# Altium footprint library Toi Library.PcbLib: 740 footprints (part 31 of 47)
Each footprint in its own frame and in the unit in brackets; x right, y up, seen from the top. Pads: shape width x height; smd on the part's side, far side on the other; paste and mask are expansions set on the pad; w line width, h text height; cw(c..) or ccw(c..) is an arc to the next point about the centre after c.
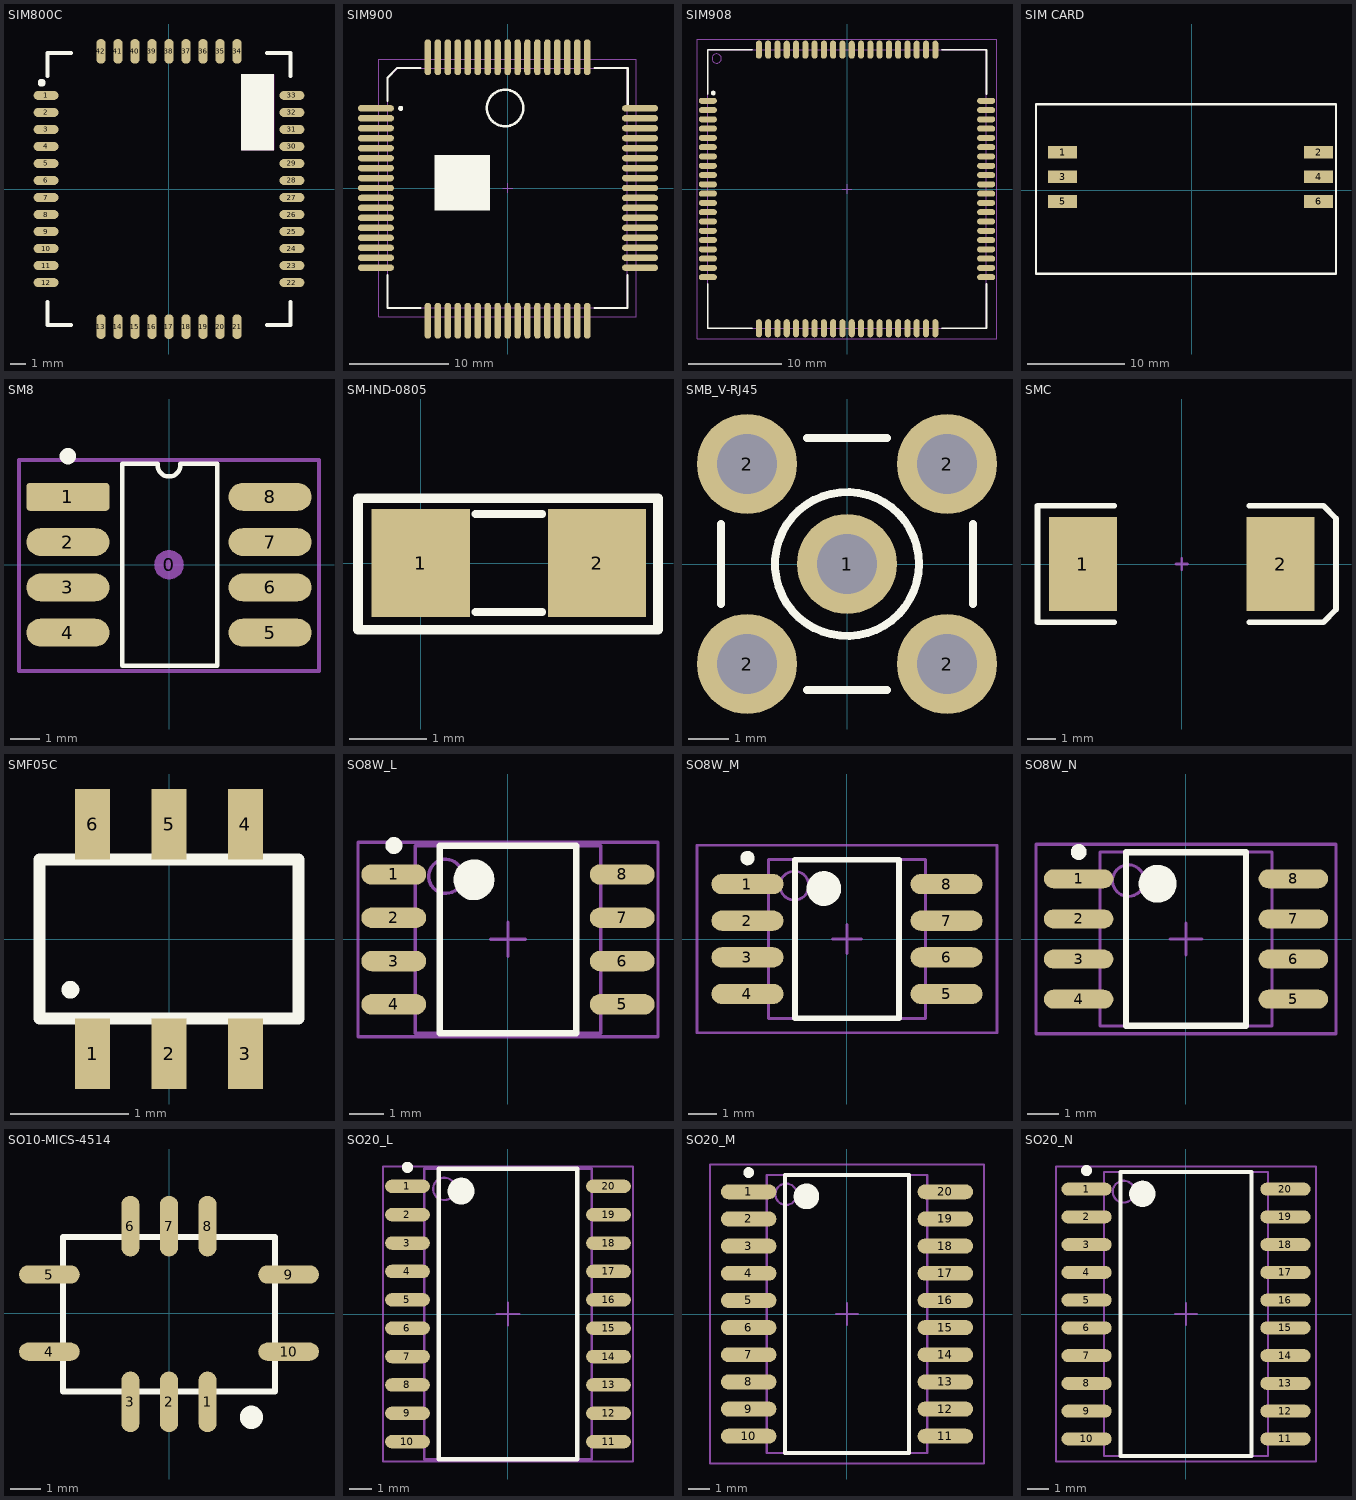
[diagram p30: the footprints below, top view; thin cyan lines are the x and y axes]

## SIM800C [mm]
pads (42):
  oval 1.6x0.6 smd: 1(-7.95,6.05) 2(-7.95,4.95) 3(-7.95,3.85) 4(-7.95,2.75) 5(-7.95,1.65) 6(-7.95,0.55) 7(-7.95,-0.55) 8(-7.95,-1.65) 9(-7.95,-2.75) 10(-7.95,-3.85) 11(-7.95,-4.95) 12(-7.95,-6.05) 22(7.95,-6.05) 23(7.95,-4.95) 24(7.95,-3.85) 25(7.95,-2.75) 26(7.95,-1.65) 27(7.95,-0.55) 28(7.95,0.55) 29(7.95,1.65) 30(7.95,2.75) 31(7.95,3.85) 32(7.95,4.95) 33(7.95,6.05)
  oval 0.6x1.6 smd: 13(-4.4,-8.9) 14(-3.3,-8.9) 15(-2.2,-8.9) 16(-1.1,-8.9) 17(0,-8.9) 18(1.1,-8.9) 19(2.2,-8.9) 20(3.3,-8.9) 21(4.4,-8.9) 34(4.4,8.9) 35(3.3,8.9) 36(2.2,8.9) 37(1.1,8.9) 38(0,8.9) 39(-1.1,8.9) 40(-2.2,8.9) 41(-3.3,8.9) 42(-4.4,8.9)
Top Layer keep-out:
  lines w0.152: 4.726,2.556 4.726,7.354 6.731,7.354 6.731,2.556 4.726,2.556
Top Overlay:
  circle w0.254: c-8.23,6.869 r0.127
  rectangle: 4.65,2.48 6.8,7.43
  lines w0.254: -7.85,-7.3 -7.85,-8.8 -6.35,-8.8 ; -7.85,7.3 -7.85,8.8 -6.35,8.8 ; 6.35,-8.8 7.85,-8.8 7.85,-7.3 ; 6.35,8.8 7.85,8.8 7.85,7.3
3D body "User Library-SIM800C-1.STEP": height 2.47, standoff 0.13, extent -7.723,-8.964 7.977,8.636

## SIM900 [mm]
pads (68):
  oval 3.6x0.65 smd: 1(-13.21,8) 2(-13.21,7) 3(-13.21,6) 4(-13.21,5) 5(-13.21,4) 6(-13.21,3) 7(-13.21,2) 8(-13.21,1) 9(-13.21,0) 10(-13.21,-1) 11(-13.21,-2) 12(-13.21,-3) 13(-13.21,-4) 14(-13.21,-5) 15(-13.21,-6) 16(-13.21,-7) 17(-13.21,-8) 35(13.3,-8) 36(13.3,-7) 37(13.3,-6) 38(13.3,-5) 39(13.3,-4) 40(13.3,-3) 41(13.3,-2) 42(13.3,-1) 43(13.3,0) 44(13.3,1) 45(13.3,2) 46(13.3,3) 47(13.3,4) 48(13.3,5) 49(13.3,6) 50(13.3,7) 51(13.3,8)
  oval 0.65x3.6 smd: 18(-8,-13.32) 19(-7,-13.32) 20(-6,-13.32) 21(-5,-13.32) 22(-4,-13.32) 23(-3,-13.32) 24(-2,-13.32) 25(-1,-13.32) 26(0,-13.32) 27(1,-13.32) 28(2,-13.32) 29(3,-13.32) 30(4,-13.32) 31(5,-13.32) 32(6,-13.32) 33(7,-13.32) 34(8,-13.32) 52(8,13.12) 53(7,13.12) 54(6,13.12) 55(5,13.12) 56(4,13.12) 57(3,13.12) 58(2,13.12) 59(1,13.12) 60(0,13.12) 61(-1,13.12) 62(-2,13.12) 63(-3,13.12) 64(-4,13.12) 65(-5,13.12) 66(-6,13.12) 67(-7,13.12) 68(-8,13.12)
Top Overlay:
  circle w0.25: c-10.725,7.99 r0.125
  circle w0.254: c-0.25,8.03 r1.832
  rectangle: -7.35,-2.27 -1.75,3.33
  lines w0.2: -12.05,-8.725 -12.05,-12.05 -8.725,-12.05 ; -12.05,8.725 -12.05,11.05 -11.05,12.05 -8.725,12.05 ; 8.725,-12.05 12.05,-12.05 12.05,-8.725 ; 8.725,12.05 12.05,12.05
  lines w0.254: 12.05,8.03 12.05,12.03
Mechanical 13:
  lines w0.1: -12,-12 -12,11 -11,12 12,12 12,-12 -12,-12
Mechanical 15:
  lines w0.1: -0.5,0 0.5,0 ; 0,-0.5 0,0.5 ; -12.925,-12.925 -12.925,12.925 12.925,12.925 12.925,-12.925 -12.925,-12.925
3D body "User Library-GSM_SIM900.STEP": height 3, standoff 0, extent -12.01,-11.99 11.99,12.01

## SIM908 [mm]
height 3
pads (80):
  oval 1.95x0.65 smd: 1(-15,9.5) 2(-15,8.5) 3(-15,7.5) 4(-15,6.5) 5(-15,5.5) 6(-15,4.5) 7(-15,3.5) 8(-15,2.5) 9(-15,1.5) 10(-15,0.5) 11(-15,-0.5) 12(-15,-1.5) 13(-15,-2.5) 14(-15,-3.5) 15(-15,-4.5) 16(-15,-5.5) 17(-15,-6.5) 18(-15,-7.5) 19(-15,-8.5) 20(-15,-9.5) 41(14.98,-9.5) 42(14.98,-8.5) 43(14.98,-7.5) 44(14.98,-6.5) 45(14.98,-5.5) 46(14.98,-4.5) 47(14.98,-3.5) 48(14.98,-2.5) 49(14.98,-1.5) 50(14.98,-0.5) 51(14.98,0.5) 52(14.98,1.5) 53(14.98,2.5) 54(14.98,3.5) 55(14.98,4.5) 56(14.98,5.5) 57(14.98,6.5) 58(14.98,7.5) 59(14.98,8.5) 60(14.98,9.5)
  oval 0.65x1.95 smd: 21(-9.5,-15) 22(-8.5,-15) 23(-7.5,-15) 24(-6.5,-15) 25(-5.5,-15) 26(-4.5,-15) 27(-3.5,-15) 28(-2.5,-15) 29(-1.5,-15) 30(-0.5,-15) 31(0.5,-15) 32(1.5,-15) 33(2.5,-15) 34(3.5,-15) 35(4.5,-15) 36(5.5,-15) 37(6.5,-15) 38(7.5,-15) 39(8.5,-15) 40(9.5,-15) 61(9.5,15.005) 62(8.5,15.005) 63(7.5,15.005) 64(6.5,15.005) 65(5.5,15.005) 66(4.5,15.005) 67(3.5,15.005) 68(2.5,15.005) 69(1.5,15.005) 70(0.5,15.005) 71(-0.5,15.005) 72(-1.5,15.005) 73(-2.5,15.005) 74(-3.5,15.005) 75(-4.5,15.005) 76(-5.5,15.005) 77(-6.5,15.005) 78(-7.5,15.005) 79(-8.5,15.005) 80(-9.5,15.005)
Top Overlay:
  circle w0.25: c-14.405,10.335 r0.125
  lines w0.2: -15,-10.225 -15,-15 -10.225,-15 ; -15,10.225 -15,15 -10.225,15 ; 10.225,-15 15,-15 15,-10.225 ; 10.225,15 15,15 15,10.225
Mechanical 13:
  circle w0.1: c-14.05,14.05 r0.5
  lines w0.1: -15,-15 -15,15 15,15 15,-15 -15,-15
Mechanical 15:
  lines w0.1: -0.5,0 0.5,0 ; 0,-0.5 0,0.5 ; -16.145,-16.155 -16.145,16.155 16.125,16.155 16.125,-16.155 -16.145,-16.155
3D body "User Library-SIM908.STEP": height 3.22, standoff 0.02, extent -14.995,-15 15.005,15

## SIM CARD [mm]
pads (6):
  rect 3x1.3 smd: 1(-13.358,3.937) 2(13.104,3.937) 3(-13.358,1.397) 4(13.104,1.397) 5(-13.358,-1.143) 6(13.104,-1.143)
Top Overlay:
  lines w0.254: -16.111,-8.603 -16.111,8.897 14.889,8.897 14.889,-8.603 -16.111,-8.603
3D body "SW3dPS-SIMLOCK-1.STEP": height 2.5, standoff 0, extent -16.129,-8.537 13.871,8.763

## SM8 [mil]
pads (9):
  round 39.37 on Mech15: 0(0,0)
  rrect25% 110x37 smd: 1(-134,90)
  oval 110x37 smd: 2(-134,30) 3(-134,-30) 4(-134,-90) 5(134,-90) 6(134,-30) 7(134,30) 8(134,90)
Top Overlay:
  circle w19.68: c-134,144 r1
  lines w6: -15,132 ccw(c0,132) 15,132 ; -15,134 -29,134 -62,134 -62,-134 64,-134 64,134 15,134
Mechanical 15:
  lines w5: -198.82,-141 -198.82,139 198.82,139 198.82,-141 -198.82,-141
3D body "SM8.stp": height 66.93, standoff 0.09, extent -142.75,-129.92 142.76,129.92

## SM-IND-0805 [mil]
pads (2):
  rect 50x55 smd: 1(0,0) 2(90,0)
Top Overlay:
  lines w4: 28,-25 62,-25 ; 28,25 62,25
  lines w5: -32,-34 121,-34 121,33 -32,33 -32,-34
3D body "45635.stp": height 9.84, standoff -9.84, extent 5.63,-24.6 84.37,24.61

## SMB_V-RJ45 [mm]
pads (5):
  round 2.5 hole 1.5: 1(0,0) 2(-2.5,-2.5) 2(-2.5,2.5) 2(2.5,-2.5) 2(2.5,2.5)
Top Overlay:
  circle w0.2: c0,0 r1.8
  lines w0.2: -3.15,-1 -3.15,1 ; -1,-3.15 1,-3.15 ; -1,3.15 1,3.15 ; 3.15,-1 3.15,1
Mechanical 1:
  circle w0.025: c0,0 r0.2
  circle w0.025: c0,0 r1.05
  circle w0.025: c0,0 r1.8
3D body "Samtec-SMB5-J-P-H-RA-TH1.STEP": height 7.64, standoff -3.28, extent -16.765,-3.22 3.685,3.21

## SMC [mm]
height 5.08
pads (2):
  rect 2.4x3.3 smd: 1(-3.475,0) 2(3.475,0)
Top Overlay:
  lines w0.2: -2.375,-2.05 -5.075,-2.05 -5.075,2.05 -2.375,2.05 ; 2.375,-2.05 4.975,-2.05 5.425,-1.6 5.425,1.6 4.975,2.055 ; 2.375,2.05 4.975,2.05
Mechanical 1:
  lines w0.1: -0.2,0 0.2,0 ; 0,-0.2 0,0.2
3D body "User Library-445-CRYTAL-SMD.STEP": height 1.32, standoff -0.03, extent -2.449,-1.6 2.551,1.6

## SMF05C [mm]
pads (6):
  rect 0.3x0.6 smd: 1(-0.65,-0.975) 2(0,-0.975) 3(0.65,-0.975) 4(0.65,0.975) 5(0,0.975) 6(-0.65,0.975)
Top Overlay:
  circle w0.1: c-0.838,-0.432 r0.025
  lines w0.1: -1.1,-0.675 1.1,-0.675 1.1,0.675 -1.1,0.675 -1.1,-0.675
3D body "SC88-6.STEP": height 1.1, standoff 0, extent -1.009,-1.049 0.991,1.151

## SO8W_L [mm] "SOP, 8-Leads, Body 5.3x5.3mm, Pitch 1.27mm, IPC High Density"
height 2.13
pads (8):
  oval 1.9x0.6 smd: 1(-3.35,1.905) 2(-3.35,0.635) 3(-3.35,-0.635) 4(-3.35,-1.905) 5(3.35,-1.905) 6(3.35,-0.635) 7(3.35,0.635) 8(3.35,1.905)
Top Overlay:
  circle w0.6: c-1,1.75 r0.3
  circle w0.25: c-3.35,2.755 r0.125
  lines w0.2: -2,-2.75 2,-2.75 2,2.75 -2,2.75 -2,-2.75
Mechanical 13:
  circle w0.1: c-1.825,1.85 r0.5
  lines w0.1: -2.725,-2.75 2.725,-2.75 2.725,2.75 -2.725,2.75 -2.725,-2.75
Mechanical 15:
  lines w0.1: -0.5,0 0.5,0 ; 0,-0.5 0,0.5 ; -4.4,-2.85 4.4,-2.85 4.4,2.85 -4.4,2.85 -4.4,-2.85
3D body: height 2.13, standoff 0, extent -2.725,-2.75 2.725,2.75

## SO8W_M [mm] "SOP, 8-Leads, Body 5.3x5.3mm, Pitch 1.27mm, IPC Low Density"
height 2.13
pads (8):
  oval 2.5x0.7 smd: 1(-3.45,1.905) 2(-3.45,0.635) 3(-3.45,-0.635) 4(-3.45,-1.905) 5(3.45,-1.905) 6(3.45,-0.635) 7(3.45,0.635) 8(3.45,1.905)
Top Overlay:
  circle w0.6: c-0.8,1.75 r0.3
  circle w0.25: c-3.45,2.805 r0.125
  lines w0.2: -1.8,-2.75 1.8,-2.75 1.8,2.75 -1.8,2.75 -1.8,-2.75
Mechanical 13:
  circle w0.1: c-1.825,1.85 r0.5
  lines w0.1: -2.725,-2.75 2.725,-2.75 2.725,2.75 -2.725,2.75 -2.725,-2.75
Mechanical 15:
  lines w0.1: -0.5,0 0.5,0 ; 0,-0.5 0,0.5 ; -5.2,-3.25 5.2,-3.25 5.2,3.25 -5.2,3.25 -5.2,-3.25
3D body: height 2.13, standoff 0, extent -2.725,-2.75 2.725,2.75

## SO8W_N [mm] "SOP, 8-Leads, Body 5.3x5.3mm, Pitch 1.27mm, IPC Medium Density"
height 2.13
pads (8):
  oval 2.2x0.6 smd: 1(-3.4,1.905) 2(-3.4,0.635) 3(-3.4,-0.635) 4(-3.4,-1.905) 5(3.4,-1.905) 6(3.4,-0.635) 7(3.4,0.635) 8(3.4,1.905)
Top Overlay:
  circle w0.6: c-0.9,1.75 r0.3
  circle w0.25: c-3.4,2.755 r0.125
  lines w0.2: -1.9,-2.75 1.9,-2.75 1.9,2.75 -1.9,2.75 -1.9,-2.75
Mechanical 13:
  circle w0.1: c-1.825,1.85 r0.5
  lines w0.1: -2.725,-2.75 2.725,-2.75 2.725,2.75 -2.725,2.75 -2.725,-2.75
Mechanical 15:
  lines w0.1: -0.5,0 0.5,0 ; 0,-0.5 0,0.5 ; -4.75,-3 4.75,-3 4.75,3 -4.75,3 -4.75,-3
3D body: height 2.13, standoff 0, extent -2.725,-2.75 2.725,2.75

## SO10-MICS-4514 [mm] "10 pn"
pads (10):
  oval 0.6x2 smd: 1(1.27,-2.921) 2(0,-2.921) 3(-1.27,-2.921) 6(-1.27,2.863) 7(0,2.863) 8(1.27,2.863)
  oval 2x0.6 smd: 4(-3.937,-1.27) 5(-3.937,1.27) 9(3.937,1.27) 10(3.937,-1.27)
Top Overlay:
  circle w0.6: c2.713,-3.429 r0.081
  lines w0.203: -3.492,-2.574 -3.492,2.506 3.492,2.506 3.492,-2.574 -3.492,-2.574

## SO20_L [mm] "SOIC, 20-Leads, Body 12.8x7.5mm, Pitch 1.27mm, IPC High Density"
height 2.65
pads (20):
  oval 2x0.6 smd: 1(-4.5,5.715) 2(-4.5,4.445) 3(-4.5,3.175) 4(-4.5,1.905) 5(-4.5,0.635) 6(-4.5,-0.635) 7(-4.5,-1.905) 8(-4.5,-3.175) 9(-4.5,-4.445) 10(-4.5,-5.715) 11(4.5,-5.715) 12(4.5,-4.445) 13(4.5,-3.175) 14(4.5,-1.905) 15(4.5,-0.635) 16(4.5,0.635) 17(4.5,1.905) 18(4.5,3.175) 19(4.5,4.445) 20(4.5,5.715)
Top Overlay:
  circle w0.25: c-4.5,6.565 r0.125
  circle w0.6: c-2.1,5.5 r0.3
  lines w0.2: -3.1,-6.5 -3.1,6.5 3.1,6.5 3.1,-6.5 -3.1,-6.5
Mechanical 13:
  circle w0.1: c-2.85,5.6 r0.5
  lines w0.1: -3.75,-6.5 -3.75,6.5 3.75,6.5 3.75,-6.5 -3.75,-6.5
Mechanical 15:
  lines w0.1: -0.5,0 0.5,0 ; 0,-0.5 0,0.5 ; -5.6,-6.6 -5.6,6.6 5.6,6.6 5.6,-6.6 -5.6,-6.6
3D body: height 2.65, standoff 0, extent -3.75,-6.5 3.75,6.5

## SO20_M [mm] "SOIC, 20-Leads, Body 12.8x7.5mm, Pitch 1.27mm, IPC Low Density"
height 2.65
pads (20):
  oval 2.6x0.7 smd: 1(-4.6,5.715) 2(-4.6,4.445) 3(-4.6,3.175) 4(-4.6,1.905) 5(-4.6,0.635) 6(-4.6,-0.635) 7(-4.6,-1.905) 8(-4.6,-3.175) 9(-4.6,-4.445) 10(-4.6,-5.715) 11(4.6,-5.715) 12(4.6,-4.445) 13(4.6,-3.175) 14(4.6,-1.905) 15(4.6,-0.635) 16(4.6,0.635) 17(4.6,1.905) 18(4.6,3.175) 19(4.6,4.445) 20(4.6,5.715)
Top Overlay:
  circle w0.25: c-4.6,6.615 r0.125
  circle w0.6: c-1.9,5.5 r0.3
  lines w0.2: -2.9,-6.5 -2.9,6.5 2.9,6.5 2.9,-6.5 -2.9,-6.5
Mechanical 13:
  circle w0.1: c-2.85,5.6 r0.5
  lines w0.1: -3.75,-6.5 -3.75,6.5 3.75,6.5 3.75,-6.5 -3.75,-6.5
Mechanical 15:
  lines w0.1: -0.5,0 0.5,0 ; 0,-0.5 0,0.5 ; -6.4,-7 -6.4,7 6.4,7 6.4,-7 -6.4,-7
3D body: height 2.65, standoff 0, extent -3.75,-6.5 3.75,6.5

## SO20_N [mm] "SOIC, 20-Leads, Body 12.8x7.5mm, Pitch 1.27mm, IPC Medium Density"
height 2.65
pads (20):
  oval 2.3x0.6 smd: 1(-4.55,5.715) 2(-4.55,4.445) 3(-4.55,3.175) 4(-4.55,1.905) 5(-4.55,0.635) 6(-4.55,-0.635) 7(-4.55,-1.905) 8(-4.55,-3.175) 9(-4.55,-4.445) 10(-4.55,-5.715) 11(4.55,-5.715) 12(4.55,-4.445) 13(4.55,-3.175) 14(4.55,-1.905) 15(4.55,-0.635) 16(4.55,0.635) 17(4.55,1.905) 18(4.55,3.175) 19(4.55,4.445) 20(4.55,5.715)
Top Overlay:
  circle w0.25: c-4.55,6.565 r0.125
  circle w0.6: c-2,5.5 r0.3
  lines w0.2: -3,-6.5 -3,6.5 3,6.5 3,-6.5 -3,-6.5
Mechanical 13:
  circle w0.1: c-2.85,5.6 r0.5
  lines w0.1: -3.75,-6.5 -3.75,6.5 3.75,6.5 3.75,-6.5 -3.75,-6.5
Mechanical 15:
  lines w0.1: -0.5,0 0.5,0 ; 0,-0.5 0,0.5 ; -5.95,-6.75 -5.95,6.75 5.95,6.75 5.95,-6.75 -5.95,-6.75
3D body: height 2.65, standoff 0, extent -3.75,-6.5 3.75,6.5